# Altium schematic symbol library LATTICEPLDS_Library.SchLib: 291 symbols (part 23 of 32)
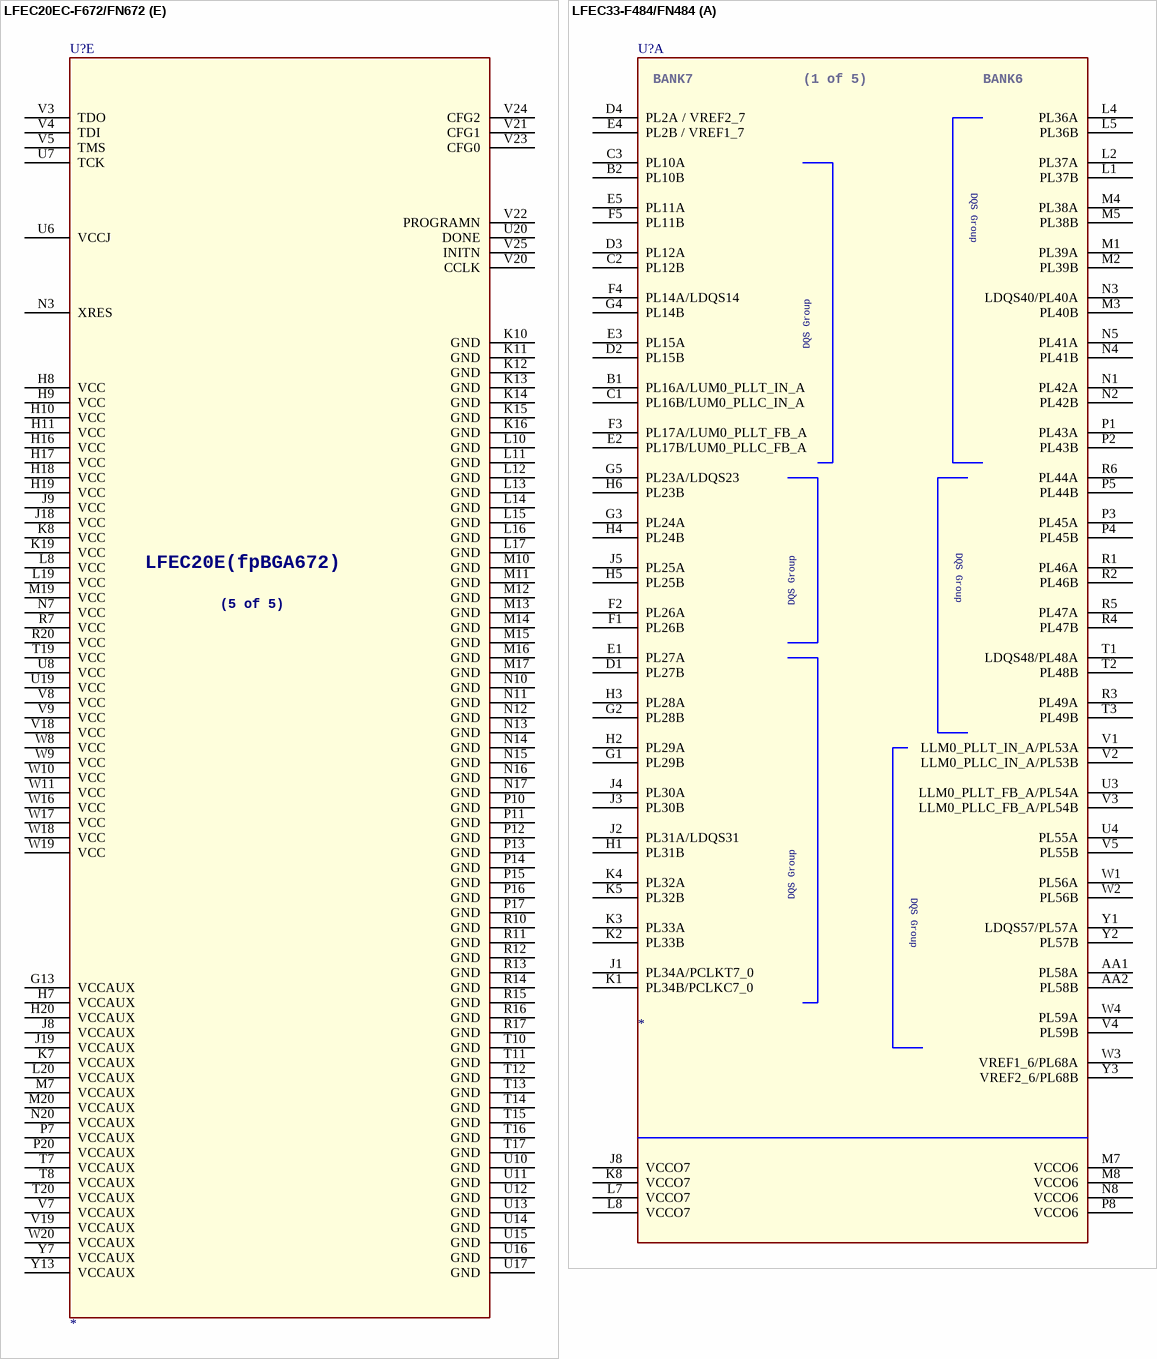
[diagram p325: symbols LFEC20EC-F672/FN672 to LFEC33-F484/FN484]

## LFEC20EC-F672/FN672
designator U?
part A pins: AA1 LDQS45 / PL45A, AB1 PL45B, AB2 PL47B, AB4 VREF1_6 / PL48A, AC1 PL47A, AC4 VREF2_6 / PL48B, B1 PL3A, C1 PL3B, D1 PL6A / LDQS6, D2 PL5A, E1 PL6B, E2 PL5B, E3 PL2A / VREF2_7, E4 PL2B / VREF1_7, F1 PL14A, F2 PL7A, F3 PL4A, F6 PL8A / LUM0_PLLT_IN_A, G1 PL14B, G2 PL7B, G3 PL4B, G4 PL9B / LUM0_PLLC_FB_A, G6 PL8B / LUM0_PLLC_IN_A, H1 PL15A, H4 PL9A / LUM0_PLLT_FB_A, J1 PL15B, J4 PL11A, J5 PL11B, J6 PL13A, K1 PL16B, K2 PL16A, K3 PL17A, K4 PL12A, K5 PL12B, K6 PL13B, K9 VCCO7 (power), L1 PL18B, L2 PL18A, L3 PL17B, L4 PL21A, L5 PL21B, L6 PL25B, L7 PL25A, L9 VCCO7 (power), M1 PL20A, M2 PL20B, M3 PL19A / LDQS19, M4 PL19B, M5 PL29A, M6 PL29B, M8 VCCO7 (power), M9 VCCO7 (power), N1 PL22B / PCLKC7_0, N2 PL22A / PCLKT7_0, N4 PL26A, N5 PL26B, N6 PL32A, N8 VCCO7 (power), N9 VCCO7 (power), P1 PL24A, P2 PL24B, P3 PL28B, P4 LDQS28 / PL28A, P5 PL32B, P6 PL33A, P8 VCCO6 (power), P9 VCCO6 (power), R1 PL27A, R2 PL27B, R3 PL31B, R4 PL31A, R5 PL33B, R6 LDQS36 / PL36A, R8 VCCO6 (power), R9 VCCO6 (power), T1 PL30A, T2 PL30B, T3 PL35A, T4 PL35B, T5 PL36B, T6 PL37A, T9 VCCO6 (power), U1 PL34A, U2 PL34B, U3 PL38A, U4 PL38B, U5 PL37B, U9 VCCO6 (power), V1 PL39A, V2 PL39B, V6 LLM0_PLLT_FB_A / PL42A, W1 LLM0_PLLT_IN_A / PL41A, W2 LLM0_PLLC_IN_A / PL41B, W3 PL44A, W4 PL44B, W6 LLM0_PLLC_FB_A / PL42B, Y1 PL43A, Y2 PL43B, Y3 PL46B, Y4 PL46A
part B pins: AA6 PB2B, AA7 PB4B, AA8 PB7B, AA9 PB14B, AA10 PB20B, AA11 PB26A, AA12 PB30A / BDQS30, AA13 WRITEN / PB34A, AA14 CSN / PB35B, AA15 PB42B, AA16 PB47B, AA17 PB48A, AA18 PB52B, AA19 BDQS54 / PB54A, AA20 PB55B, AB6 PB2A, AB7 PB4A, AB8 PB6A / BDQS6, AB9 PB11B, AB10 PB18B, AB11 PB24B, AB12 PB30B, AB13 CS1N / PB34B, AB14 D7 / PB36B, AB15 D2 / PB40B, AB16 PB46B, AB17 PB51B, AB18 PB56B, AC5 PB5B, AC6 PB5A, AC7 PB3A, AC8 PB6B, AC9 PB10B, AC10 PB16B, AC11 PB23B, AC12 PB29B, AC13 PB32B / VREF1_5, AC14 VREF2_4 / PB36A, AC15 D4 / PB38B, AC16 PB44B, AC17 PB50B, AC18 PB56A, AD4 PB9B, AD5 PB9A, AD6 PB16A, AD7 PB20A, AD8 PB10A, AD9 PB12B, AD10 PB19B, AD11 PB22A / BDQS22, AD12 PB29A, AD13 PB32A / VREF2_5, AD14 VREF1_4 / PB35A, AD15 BDQS38 / PB38A, AD16 BDQS46 / PB46A, AD17 PB43A, AD18 PB44A, AE2 PB7A, AE3 PB11A, AE4 PB13A, AE5 PB14A / BDQS14, AE6 PB17B, AE7 PB19A, AE8 PB23A, AE9 PB25B, AE10 PB25A, AE11 PB27A, AE12 PB28B, AE13 PB31A, AE14 PB33B / PCLKC5_0, AE15 D6 / PB37B, AE16 PB40A, AE17 D1 / PB41B, AE18 PB45A, AE19 PB53A, AE20 PB53B, AE21 PB50A, AE22 PB52A, AE23 PB57B, AF2 PB8A, AF3 PB12A, AF4 PB13B, AF5 PB15A, AF6 PB17A, AF7 PB18A, AF8 PB21A, AF9 PB21B, AF10 PB24A, AF11 PB27B, AF12 PB28A, AF13 PB31B, AF14 PB33A / PCLKT5_0, AF15 D5 / PB37A, AF16 PB39A, AF17 PB41A, AF18 PB45B, AF19 PB47A, AF20 PB49B, AF21 PB49A, AF22 PB51A, AF23 PB55A, AF24 PB57A, V10 VCCO5 (power), V11 VCCO5 (power), V12 VCCO5 (power), V13 VCCO5 (power), V14 VCCO4 (power), V15 VCCO4 (power), V16 VCCO4 (power), V17 VCCO4 (power), W12 VCCO5 (power), W13 VCCO5 (power), W14 VCCO4 (power), W15 VCCO4 (power), Y8 PB3B, Y9 PB8B, Y10 PB15B, Y11 PB22B, Y12 PB26B, Y14 D3 / PB39B, Y15 PB42A, Y16 PB43B, Y17 PB48B, Y18 PB54B
part C pins: AA25 PR46A, AA26 PR45A / RDQS45, AB25 PR46B, AB26 PR45B, AC23 PR48B / VREF2_3, AC24 PR48A / VREF1_3, AC25 PR47B, AC26 PR47A, C25 PR3A, C26 PR3B, D23 VREF2_2 / PR2A, D25 RDQS6 / PR6A, D26 PR6B, E23 VREF1_2 / PR2B, F21 PR5B, F25 RUM0_PLLC_FB_A / PR9B, G21 PR7A, G22 PR5A, G23 PR4A, G24 PR4B, G25 RUM0_PLLT_FB_A / PR9A, H21 PR7B, H23 RUM0_PLLC_IN_A / PR8B, H24 RUM0_PLLT_IN_A / PR8A, H25 PR14B, H26 PR15A, J20 PR12A, J24 PR14A, J25 PR16A, J26 PR15B, K17 VCCO2 (power), K18 VCCO2 (power), K20 PR12B, K21 PR13B, K22 PR13A, K23 PR11B, K24 PR11A, K25 PR16B, K26 PCLKT2_0 / PR22A, L18 VCCO2 (power), L21 RDQS19 / PR19A, L22 PR18B, L23 PR18A, L24 PR17A, L25 PR17B, L26 PCLKC2_0 / PR22B, M18 VCCO2 (power), M21 PR19B, M22 PR21B, M23 PR21A, M24 PR20A, M25 PR20B, M26 PR27A, N18 VCCO2 (power), N19 VCCO2 (power), N21 PR26B, N22 PR25A, N23 PR25B, N24 PR24A, N25 PR24B, N26 PR27B, P18 VCCO3 (power), P19 VCCO3 (power), P21 PR26A, P22 PR28A / RDQS28, P23 PR28B, P24 PR29A, P25 PR29B, P26 PR31A, R18 VCCO3 (power), R19 VCCO3 (power), R21 PR30B, R22 PR30A, R23 PR33A, R24 PR32A, R25 PR32B, R26 PR31B, T18 VCCO3 (power), T21 PR36A / RDQS36, T22 PR34B, T23 PR34A, T24 PR33B, T25 PR35B, T26 PR35A, U18 VCCO3 (power), U21 PR36B, U22 PR37A, U23 PR37B, U24 PR38B, U25 PR38A, U26 PR39A, V26 PR39B, W21 PR43A / RLM0_PLLT_FB_A, W22 PR43B / RLM0_PLLC_FB_A, W23 PR44B / RLM0_PLLC_IN_A, W24 PR44A / RLM0_PLLT_IN_A, W25 PR41B / BUSY / SISPI, W26 PR41A / D7 / SPID0, Y25 PR42B / DI / CSSPIN, Y26 PR42A / DOUT / CSOB
part D pins: A2 PT9A, A3 PT9B, A4 PT13A, A5 PT13B, A6 PT16A, A7 PT20A, A8 PT23A, A9 PT25A, A10 PT26A, A11 PT28B, A12 PT29B, A13 PT31B, A14 PCLKT0_0 / PT33A, A15 PT37A, A16 PT41A, A17 PT41B, A18 PT43A, A19 PT45B, A20 PT46A / TDQS46, A21 PT51A, A22 PT52A, A23 PT57A, A24 PT57B, B3 PT7A, B4 PT8A, B5 PT10A, B6 PT12A, B7 PT21A, B8 PT21B, B9 PT24A, B10 PT26B, B11 PT28A, B12 PT29A, B13 PT31A, B14 PCLKC0_0 / PT33B, B15 PT37B, B16 PT40A, B17 PT50A, B18 PT42A, B19 PT45A, B20 PT47A, B21 PT54A / TDQS54, B22 PT55A, C4 PT5B, C5 PT5A, C6 PT18A, C7 PT19A, C8 PT11A, C9 PT15A, C10 PT17B, C11 TDQS22 / PT22A, C12 PT27A, C13 VREF2_0 / PT32A, C14 PT34A, C15 PT39A, C16 PT44A, C17 PT49B, C18 PT53A, D4 PT4A, D6 PT3A, D7 PT2B, D8 PT6B, D9 TDQS14 / PT14A, D10 PT17A, D11 PT22B, D12 PT27B, D13 VREF1_0 / PT32B, D14 PT35B / VREF2_1, D15 PT40B, D16 PT44B, D17 PT49A, D18 PT53B, D19 PT56A, E6 PT2A, E7 PT4B, E8 PT7B, E9 PT11B, E10 PT15B, E11 PT20B, E12 PT24B, E13 PT35A / VREF1_1, E14 PT36B, E15 PT39B, E16 PT46B, E17 PT50B, E18 PT56B, E20 PT48A, F7 PT3B, F8 PT8B, F9 PT12B, F10 PT16B, F11 PT23B, F12 TDQS30 / PT30A, F13 PT30B, F14 PT34B, F15 PT38B, F16 PT43B, F17 PT48B, F18 PT52B, F19 PT55B, G7 TDQS6 / PT6A, G8 PT10B, G9 PT14B, G10 PT18B, G11 PT19B, G12 PT25B, G14 PT36A, G15 PT38A / TDQS38, G16 PT42B, G17 PT47B, G18 PT51B, G19 PT54B, H12 VCCO0 (power), H13 VCCO0 (power), H14 VCCO1 (power), H15 VCCO1 (power), J10 VCCO0 (power), J11 VCCO0 (power), J12 VCCO0 (power), J13 VCCO0 (power), J14 VCCO1 (power), J15 VCCO1 (power), J16 VCCO1 (power), J17 VCCO1 (power)
part E pins: G13 VCCAUX (power), H7 VCCAUX (power), H8 VCC (power), H9 VCC (power), H10 VCC (power), H11 VCC (power), H16 VCC (power), H17 VCC (power), H18 VCC (power), H19 VCC (power), H20 VCCAUX (power), J8 VCCAUX (power), J9 VCC (power), J18 VCC (power), J19 VCCAUX (power), K7 VCCAUX (power), K8 VCC (power), K10 GND (power), K11 GND (power), K12 GND (power), K13 GND (power), K14 GND (power), K15 GND (power), K16 GND (power), K19 VCC (power), L8 VCC (power), L10 GND (power), L11 GND (power), L12 GND (power), L13 GND (power), L14 GND (power), L15 GND (power), L16 GND (power), L17 GND (power), L19 VCC (power), L20 VCCAUX (power), M7 VCCAUX (power), M10 GND (power), M11 GND (power), M12 GND (power), M13 GND (power), M14 GND (power), M15 GND (power), M16 GND (power), M17 GND (power), M19 VCC (power), M20 VCCAUX (power), N3 XRES, N7 VCC (power), N10 GND (power), N11 GND (power), N12 GND (power), N13 GND (power), N14 GND (power), N15 GND (power), N16 GND (power), N17 GND (power), N20 VCCAUX (power), P7 VCCAUX (power), P10 GND (power), P11 GND (power), P12 GND (power), P13 GND (power), P14 GND (power), P15 GND (power), P16 GND (power), P17 GND (power), P20 VCCAUX (power), R7 VCC (power), R10 GND (power), R11 GND (power), R12 GND (power), R13 GND (power), R14 GND (power), R15 GND (power), R16 GND (power), R17 GND (power), R20 VCC (power), T7 VCCAUX (power), T8 VCCAUX (power), T10 GND (power), T11 GND (power), T12 GND (power), T13 GND (power), T14 GND (power), T15 GND (power), T16 GND (power), T17 GND (power), T19 VCC (power), T20 VCCAUX (power), U6 VCCJ, U7 TCK, U8 VCC (power), U10 GND (power), U11 GND (power), U12 GND (power), U13 GND (power), U14 GND (power), U15 GND (power), U16 GND (power), U17 GND (power), U19 VCC (power), U20 DONE, V3 TDO, V4 TDI, V5 TMS, V7 VCCAUX (power), V8 VCC (power), V9 VCC (power), V18 VCC (power), V19 VCCAUX (power), V20 CCLK, V21 CFG1, V22 PROGRAMN, V23 CFG0, V24 CFG2, V25 INITN, W8 VCC (power), W9 VCC (power), W10 VCC (power), W11 VCC (power), W16 VCC (power), W17 VCC (power), W18 VCC (power), W19 VCC (power), W20 VCCAUX (power), Y7 VCCAUX (power), Y13 VCCAUX (power)
part A text: BANK7; BANK6; LFEC20E(fpBGA672); (1 of 5)
part B text: BANK5; BANK4; LFEC20E(fpBGA672); (2 of 5)
part C text: BANK3; BANK2; LFEC20E(fpBGA672); (3 of 5)
part D text: BANK1; BANK0; LFEC20E(fpBGA672); (4 of 5)
part E text: LFEC20E(fpBGA672); (5 of 5)

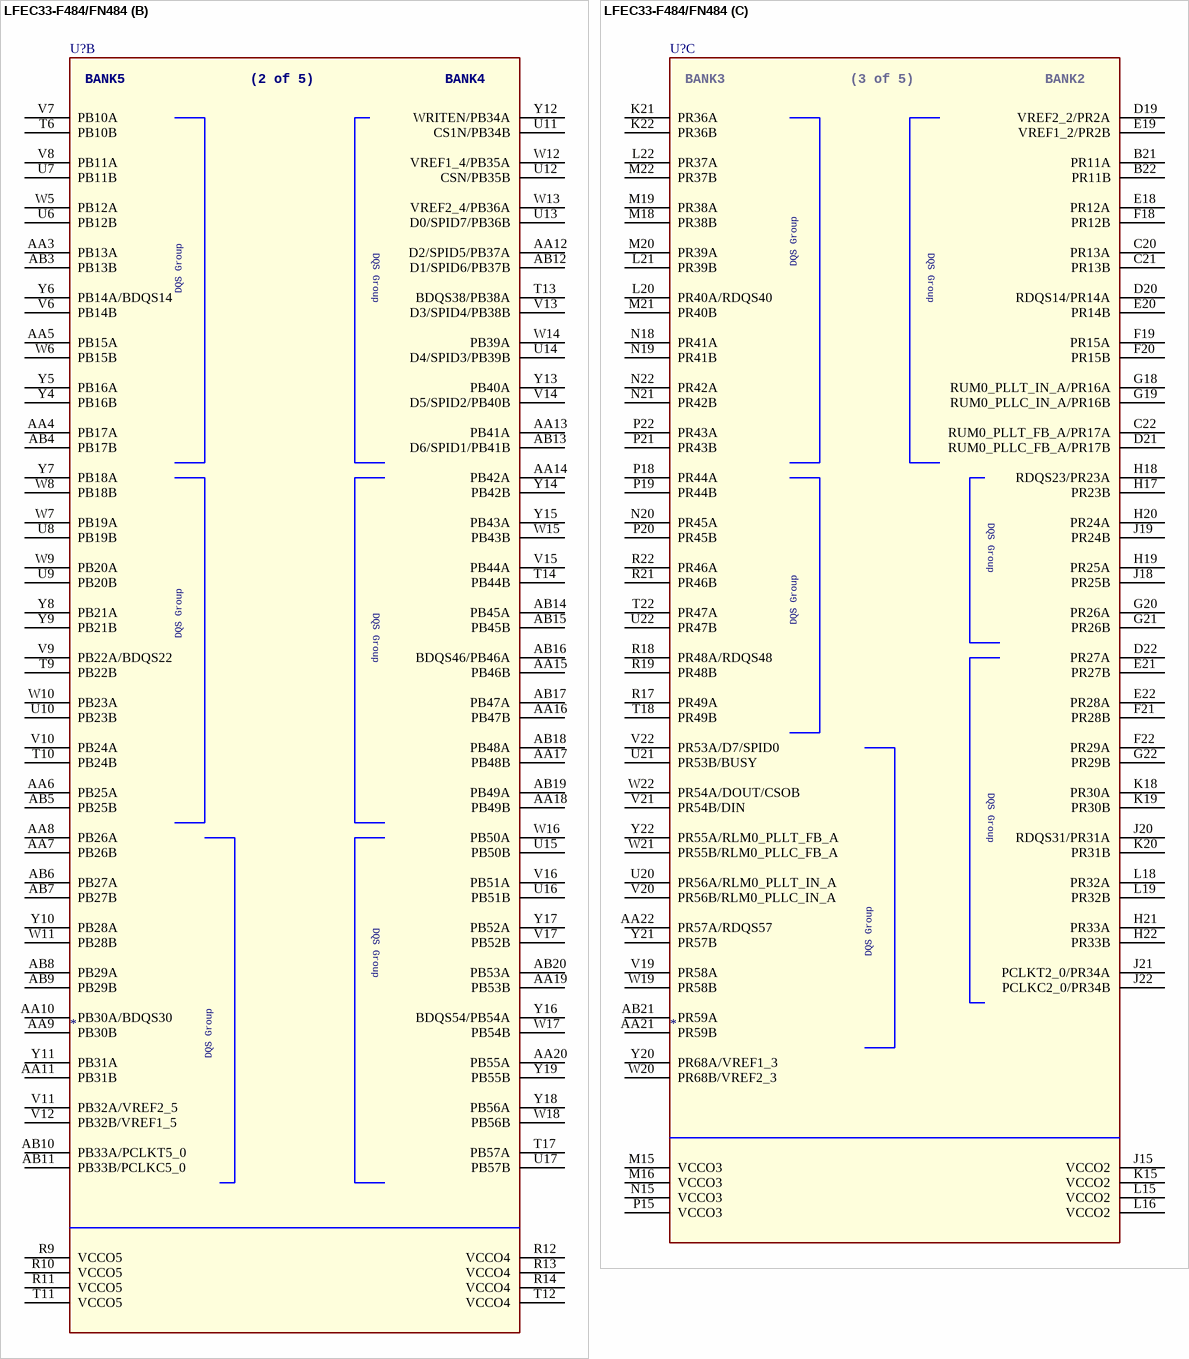
[diagram p219: symbol LFEC33-F484/FN484]

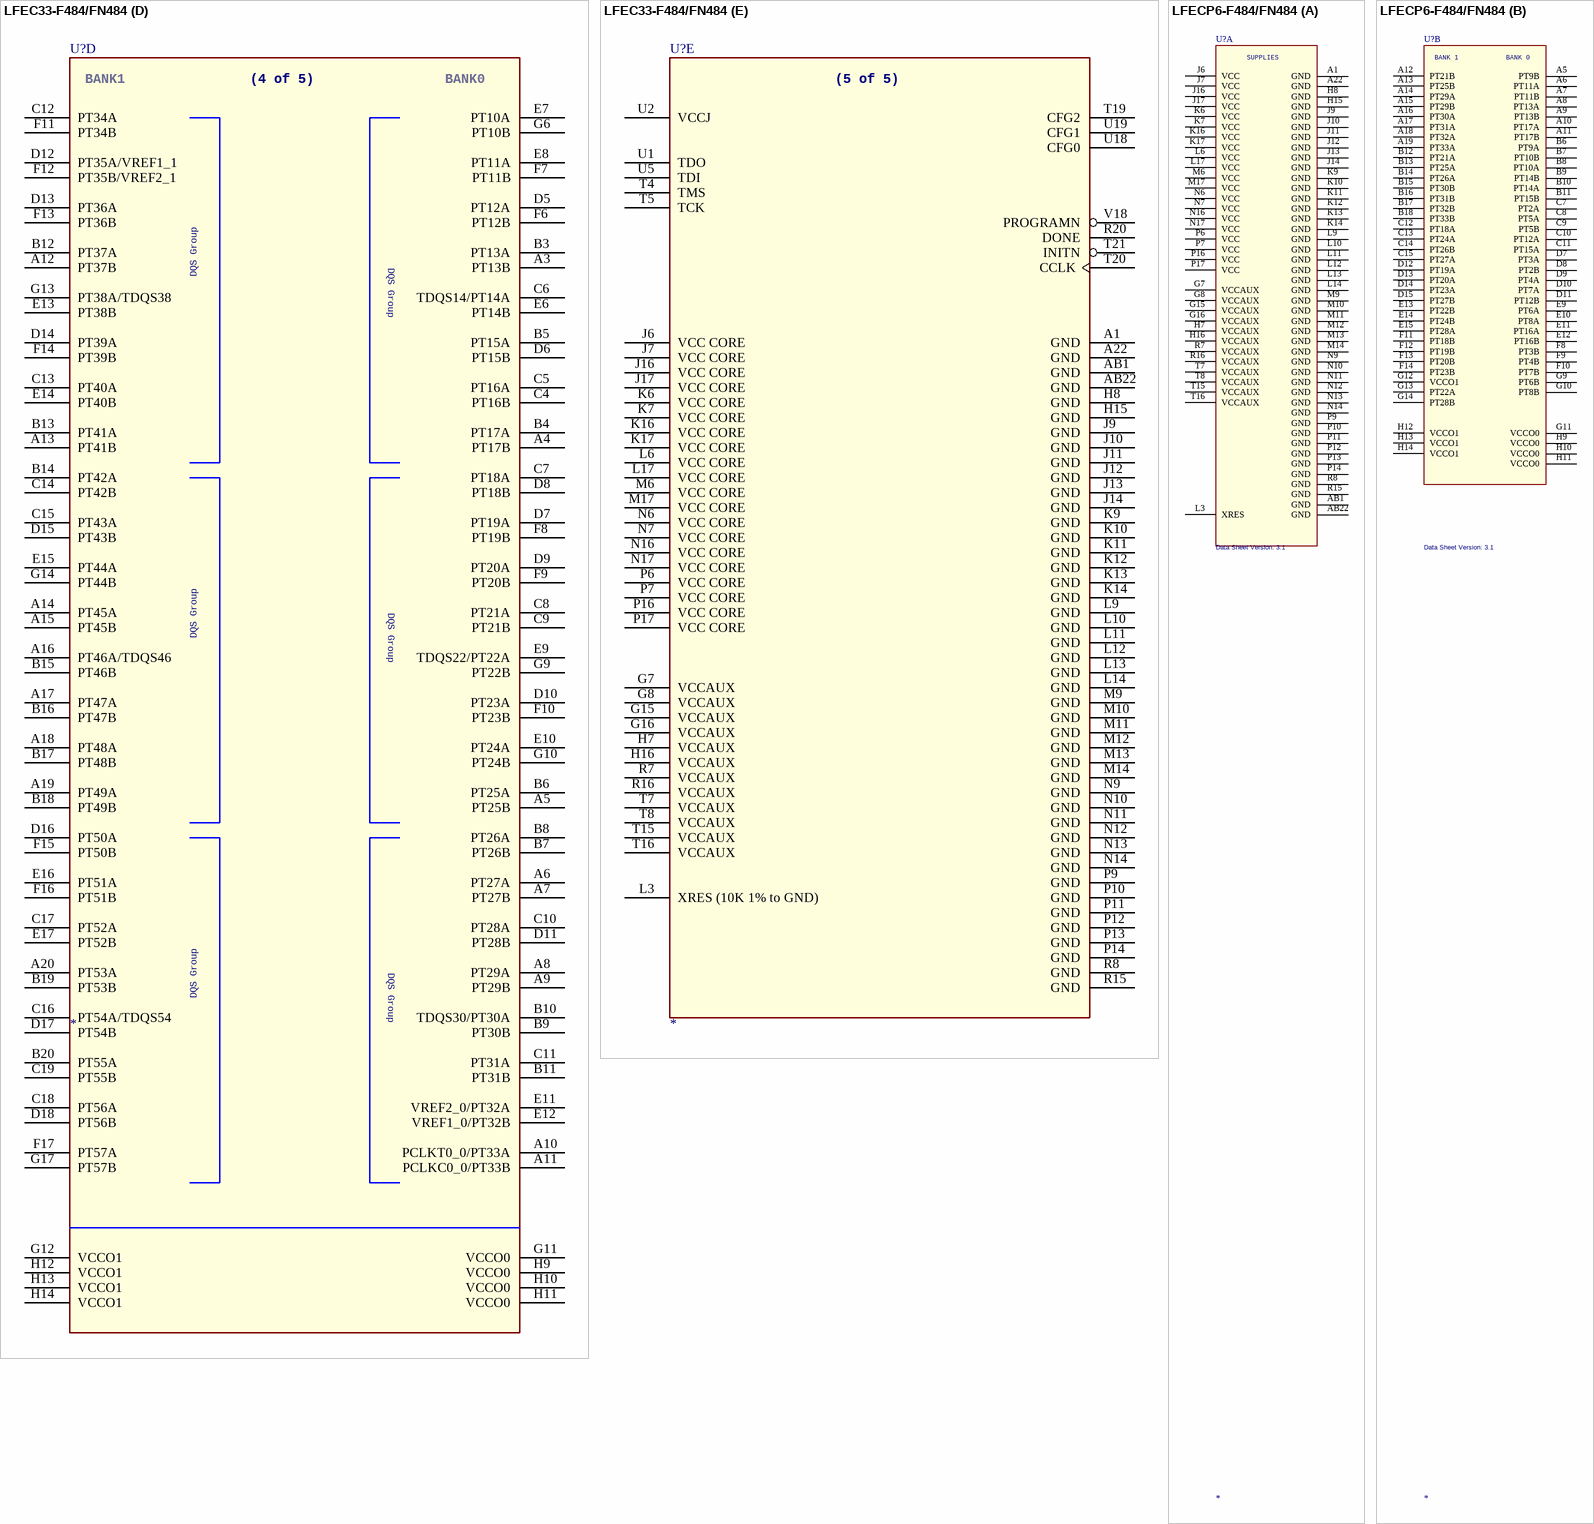
[diagram p220: symbols LFEC33-F484/FN484 to LFECP6-F484/FN484]

## LFEC33-F484/FN484
designator U?
footprint fpBGA484
part A pins: AA1 PL58A, AA2 PL58B, B1 PL16A/LUM0_PLLT_IN_A, B2 PL10B, C1 PL16B/LUM0_PLLC_IN_A, C2 PL12B, C3 PL10A, D1 PL27B, D2 PL15B, D3 PL12A, D4 PL2A / VREF2_7, E1 PL27A, E2 PL17B/LUM0_PLLC_FB_A, E3 PL15A, E4 PL2B / VREF1_7, E5 PL11A, F1 PL26B, F2 PL26A, F3 PL17A/LUM0_PLLT_FB_A, F4 PL14A/LDQS14, F5 PL11B, G1 PL29B, G2 PL28B, G3 PL24A, G4 PL14B, G5 PL23A/LDQS23, H1 PL31B, H2 PL29A, H3 PL28A, H4 PL24B, H5 PL25B, H6 PL23B, J1 PL34A/PCLKT7_0, J2 PL31A/LDQS31, J3 PL30B, J4 PL30A, J5 PL25A, J8 VCCO7 (power), K1 PL34B/PCLKC7_0, K2 PL33B, K3 PL33A, K4 PL32A, K5 PL32B, K8 VCCO7 (power), L1 PL37B, L2 PL37A, L4 PL36A, L5 PL36B, L7 VCCO7 (power), L8 VCCO7 (power), M1 PL39A, M2 PL39B, M3 PL40B, M4 PL38A, M5 PL38B, M7 VCCO6 (power), M8 VCCO6 (power), N1 PL42A, N2 PL42B, N3 LDQS40/PL40A, N4 PL41B, N5 PL41A, N8 VCCO6 (power), P1 PL43A, P2 PL43B, P3 PL45A, P4 PL45B, P5 PL44B, P8 VCCO6 (power), R1 PL46A, R2 PL46B, R3 PL49A, R4 PL47B, R5 PL47A, R6 PL44A, T1 LDQS48/PL48A, T2 PL48B, T3 PL49B, U3 LLM0_PLLT_FB_A/PL54A, U4 PL55A, V1 LLM0_PLLT_IN_A/PL53A, V2 LLM0_PLLC_IN_A/PL53B, V3 LLM0_PLLC_FB_A/PL54B, V4 PL59B, V5 PL55B, W1 PL56A, W2 PL56B, W3 VREF1_6/PL68A, W4 PL59A, Y1 LDQS57/PL57A, Y2 PL57B, Y3 VREF2_6/PL68B
part B pins: AA3 PB13A, AA4 PB17A, AA5 PB15A, AA6 PB25A, AA7 PB26B, AA8 PB26A, AA9 PB30B, AA10 PB30A/BDQS30, AA11 PB31B, AA12 D2/SPID5/PB37A, AA13 PB41A, AA14 PB42A, AA15 PB46B, AA16 PB47B, AA17 PB48B, AA18 PB49B, AA19 PB53B, AA20 PB55A, AB3 PB13B, AB4 PB17B, AB5 PB25B, AB6 PB27A, AB7 PB27B, AB8 PB29A, AB9 PB29B, AB10 PB33A/PCLKT5_0, AB11 PB33B/PCLKC5_0, AB12 D1/SPID6/PB37B, AB13 D6/SPID1/PB41B, AB14 PB45A, AB15 PB45B, AB16 BDQS46/PB46A, AB17 PB47A, AB18 PB48A, AB19 PB49A, AB20 PB53A, R9 VCCO5 (power), R10 VCCO5 (power), R11 VCCO5 (power), R12 VCCO4 (power), R13 VCCO4 (power), R14 VCCO4 (power), T6 PB10B, T9 PB22B, T10 PB24B, T11 VCCO5 (power), T12 VCCO4 (power), T13 BDQS38/PB38A, T14 PB44B, T17 PB57A, U6 PB12B, U7 PB11B, U8 PB19B, U9 PB20B, U10 PB23B, U11 CS1N/PB34B, U12 CSN/PB35B, U13 D0/SPID7/PB36B, U14 D4/SPID3/PB39B, U15 PB50B, U16 PB51B, U17 PB57B, V6 PB14B, V7 PB10A, V8 PB11A, V9 PB22A/BDQS22, V10 PB24A, V11 PB32A/VREF2_5, V12 PB32B/VREF1_5, V13 D3/SPID4/PB38B, V14 D5/SPID2/PB40B, V15 PB44A, V16 PB51A, V17 PB52B, W5 PB12A, W6 PB15B, W7 PB19A, W8 PB18B, W9 PB20A, W10 PB23A, W11 PB28B, W12 VREF1_4/PB35A, W13 VREF2_4/PB36A, W14 PB39A, W15 PB43B, W16 PB50A, W17 PB54B, W18 PB56B, Y4 PB16B, Y5 PB16A, Y6 PB14A/BDQS14, Y7 PB18A, Y8 PB21A, Y9 PB21B, Y10 PB28A, Y11 PB31A, Y12 WRITEN/PB34A, Y13 PB40A, Y14 PB42B, Y15 PB43A, Y16 BDQS54/PB54A, Y17 PB52A, Y18 PB56A, Y19 PB55B
part C pins: AA21 PR59B, AA22 PR57A/RDQS57, AB21 PR59A, B21 PR11A, B22 PR11B, C20 PR13A, C21 PR13B, C22 RUM0_PLLT_FB_A/PR17A, D19 VREF2_2/PR2A, D20 RDQS14/PR14A, D21 RUM0_PLLC_FB_A/PR17B, D22 PR27A, E18 PR12A, E19 VREF1_2/PR2B, E20 PR14B, E21 PR27B, E22 PR28A, F18 PR12B, F19 PR15A, F20 PR15B, F21 PR28B, F22 PR29A, G18 RUM0_PLLT_IN_A/PR16A, G19 RUM0_PLLC_IN_A/PR16B, G20 PR26A, G21 PR26B, G22 PR29B, H17 PR23B, H18 RDQS23/PR23A, H19 PR25A, H20 PR24A, H21 PR33A, H22 PR33B, J15 VCCO2 (power), J18 PR25B, J19 PR24B, J20 RDQS31/PR31A, J21 PCLKT2_0/PR34A, J22 PCLKC2_0/PR34B, K15 VCCO2 (power), K18 PR30A, K19 PR30B, K20 PR31B, K21 PR36A, K22 PR36B, L15 VCCO2 (power), L16 VCCO2 (power), L18 PR32A, L19 PR32B, L20 PR40A/RDQS40, L21 PR39B, L22 PR37A, M15 VCCO3 (power), M16 VCCO3 (power), M18 PR38B, M19 PR38A, M20 PR39A, M21 PR40B, M22 PR37B, N15 VCCO3 (power), N18 PR41A, N19 PR41B, N20 PR45A, N21 PR42B, N22 PR42A, P15 VCCO3 (power), P18 PR44A, P19 PR44B, P20 PR45B, P21 PR43B, P22 PR43A, R17 PR49A, R18 PR48A/RDQS48, R19 PR48B, R21 PR46B, R22 PR46A, T18 PR49B, T22 PR47A, U20 PR56A/RLM0_PLLT_IN_A, U21 PR53B/BUSY, U22 PR47B, V19 PR58A, V20 PR56B/RLM0_PLLC_IN_A, V21 PR54B/DIN, V22 PR53A/D7/SPID0, W19 PR58B, W20 PR68B/VREF2_3, W21 PR55B/RLM0_PLLC_FB_A, W22 PR54A/DOUT/CSOB, Y20 PR68A/VREF1_3, Y21 PR57B, Y22 PR55A/RLM0_PLLT_FB_A
part D pins: A3 PT13B, A4 PT17B, A5 PT25B, A6 PT27A, A7 PT27B, A8 PT29A, A9 PT29B, A10 PCLKT0_0/PT33A, A11 PCLKC0_0/PT33B, A12 PT37B, A13 PT41B, A14 PT45A, A15 PT45B, A16 PT46A/TDQS46, A17 PT47A, A18 PT48A, A19 PT49A, A20 PT53A, B3 PT13A, B4 PT17A, B5 PT15A, B6 PT25A, B7 PT26B, B8 PT26A, B9 PT30B, B10 TDQS30/PT30A, B11 PT31B, B12 PT37A, B13 PT41A, B14 PT42A, B15 PT46B, B16 PT47B, B17 PT48B, B18 PT49B, B19 PT53B, B20 PT55A, C4 PT16B, C5 PT16A, C6 TDQS14/PT14A, C7 PT18A, C8 PT21A, C9 PT21B, C10 PT28A, C11 PT31A, C12 PT34A, C13 PT40A, C14 PT42B, C15 PT43A, C16 PT54A/TDQS54, C17 PT52A, C18 PT56A, C19 PT55B, D5 PT12A, D6 PT15B, D7 PT19A, D8 PT18B, D9 PT20A, D10 PT23A, D11 PT28B, D12 PT35A/VREF1_1, D13 PT36A, D14 PT39A, D15 PT43B, D16 PT50A, D17 PT54B, D18 PT56B, E6 PT14B, E7 PT10A, E8 PT11A, E9 TDQS22/PT22A, E10 PT24A, E11 VREF2_0/PT32A, E12 VREF1_0/PT32B, E13 PT38B, E14 PT40B, E15 PT44A, E16 PT51A, E17 PT52B, F6 PT12B, F7 PT11B, F8 PT19B, F9 PT20B, F10 PT23B, F11 PT34B, F12 PT35B/VREF2_1, F13 PT36B, F14 PT39B, F15 PT50B, F16 PT51B, F17 PT57A, G6 PT10B, G9 PT22B, G10 PT24B, G11 VCCO0 (power), G12 VCCO1 (power), G13 PT38A/TDQS38, G14 PT44B, G17 PT57B, H9 VCCO0 (power), H10 VCCO0 (power), H11 VCCO0 (power), H12 VCCO1 (power), H13 VCCO1 (power), H14 VCCO1 (power)
part E pins: A1 GND (power), A22 GND (power), AB1 GND (power), AB22 GND (power), G7 VCCAUX (power), G8 VCCAUX (power), G15 VCCAUX (power), G16 VCCAUX (power), H7 VCCAUX (power), H8 GND (power), H15 GND (power), H16 VCCAUX (power), J6 VCC CORE (power), J7 VCC CORE (power), J9 GND (power), J10 GND (power), J11 GND (power), J12 GND (power), J13 GND (power), J14 GND (power), J16 VCC CORE (power), J17 VCC CORE (power), K6 VCC CORE (power), K7 VCC CORE (power), K9 GND (power), K10 GND (power), K11 GND (power), K12 GND (power), K13 GND (power), K14 GND (power), K16 VCC CORE (power), K17 VCC CORE (power), L3 XRES (10K 1% to GND), L6 VCC CORE (power), L9 GND (power), L10 GND (power), L11 GND (power), L12 GND (power), L13 GND (power), L14 GND (power), L17 VCC CORE (power), M6 VCC CORE (power), M9 GND (power), M10 GND (power), M11 GND (power), M12 GND (power), M13 GND (power), M14 GND (power), M17 VCC CORE (power), N6 VCC CORE (power), N7 VCC CORE (power), N9 GND (power), N10 GND (power), N11 GND (power), N12 GND (power), N13 GND (power), N14 GND (power), N16 VCC CORE (power), N17 VCC CORE (power), P6 VCC CORE (power), P7 VCC CORE (power), P9 GND (power), P10 GND (power), P11 GND (power), P12 GND (power), P13 GND (power), P14 GND (power), P16 VCC CORE (power), P17 VCC CORE (power), R7 VCCAUX (power), R8 GND (power), R15 GND (power), R16 VCCAUX (power), R20 DONE, T4 TMS, T5 TCK, T7 VCCAUX (power), T8 VCCAUX (power), T15 VCCAUX (power), T16 VCCAUX (power), T19 CFG2, T20 CCLK, T21 INITN, U1 TDO, U2 VCCJ, U5 TDI, U18 CFG0, U19 CFG1, V18 PROGRAMN
